# Altium footprint library Common Components.PcbLib: 94 footprints (part 1 of 6)
Each footprint in its own frame and in the unit in brackets; x right, y up, seen from the top. Pads: shape width x height; smd on the part's side, far side on the other; paste and mask are expansions set on the pad; w line width, h text height; cw(c..) or ccw(c..) is an arc to the next point about the centre after c.
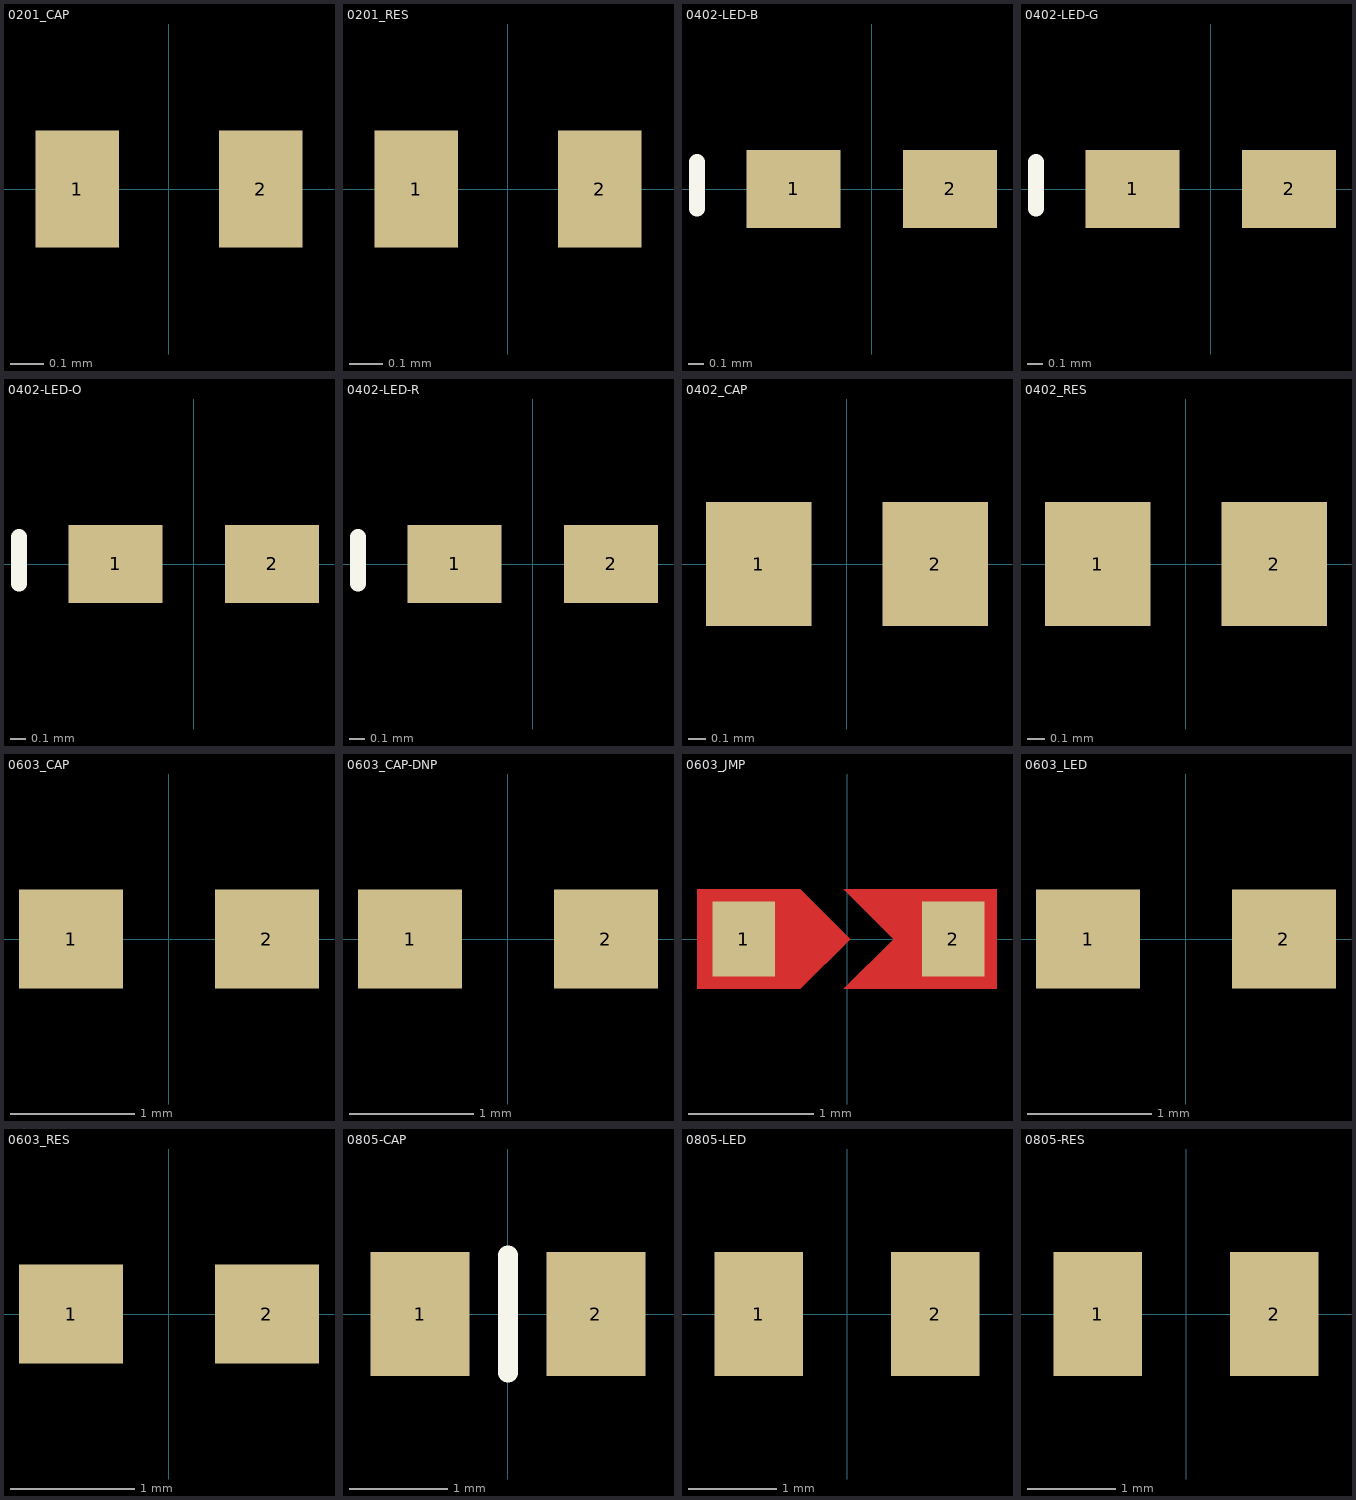
[diagram p0: the footprints below, top view; thin cyan lines are the x and y axes]

## 0201_CAP [mm]
pads (2):
  rect 0.25x0.35 smd: 1(-0.275,0) 2(0.275,0)
3D body "CAP_0201.step": height 0.31, standoff 0.01, extent -0.3,-0.15 0.3,0.15

## 0201_RES [mm]
pads (2):
  rect 0.25x0.35 smd: 1(-0.275,0) 2(0.275,0)
3D body "RES_0201.step": height 0.24, standoff 0.01, extent -0.3,-0.15 0.3,0.15

## 0402-LED-B [mm] "Chip LED, Blue 0402"
height 0.55
pads (2):
  rect 0.6x0.5 smd: 1(-0.5,0) 2(0.5,0)
Top Overlay:
  lines w0.1: -1.118,-0.127 -1.118,0.173
3D body "LED_0402_B.STEP": height 0.2, standoff 0, extent -0.5,-0.3 0.5,0.3

## 0402-LED-G [mm] "Chip LED, Green 0402"
height 0.55
pads (2):
  rect 0.6x0.5 smd: 1(-0.5,0) 2(0.5,0)
Top Overlay:
  lines w0.1: -1.118,-0.127 -1.118,0.173
3D body "LED_0402_G.STEP": height 0.2, standoff 0, extent -0.5,-0.3 0.5,0.3

## 0402-LED-O [mm] "Chip LED, Orange 0402"
height 0.55
pads (2):
  rect 0.6x0.5 smd: 1(-0.5,0) 2(0.5,0)
Top Overlay:
  lines w0.1: -1.118,-0.127 -1.118,0.173
3D body "LED_0402_O.STEP": height 0.2, standoff 0, extent -0.5,-0.3 0.5,0.3

## 0402-LED-R [mm] "Chip LED, Red 0402"
height 0.55
pads (2):
  rect 0.6x0.5 smd: 1(-0.5,0) 2(0.5,0)
Top Overlay:
  lines w0.1: -1.118,-0.127 -1.118,0.173
3D body "LED_0402_R.STEP": height 0.2, standoff 0, extent -0.5,-0.3 0.5,0.3

## 0402_CAP [mm]
pads (2):
  rect 0.6x0.7 smd: 1(-0.5,0) 2(0.5,0)
3D body "CAP_0402.step": height 0.51, standoff 0.01, extent -0.5,-0.25 0.5,0.25

## 0402_RES [mm]
pads (2):
  rect 0.6x0.7 smd: 1(-0.5,0) 2(0.5,0)
3D body "RES_0402.step": height 0.36, standoff 0.01, extent -0.5,-0.25 0.5,0.25

## 0603_CAP [mm]
pads (2):
  rect 0.838x0.8 smd: 1(-0.787,0) 2(0.788,0)
3D body "CAP_0603.step": height 0.81, standoff 0.01, extent -0.8,-0.4 0.8,0.4

## 0603_CAP-DNP [mm]
pads (2):
  rect 0.838x0.8 smd: 1(-0.787,0) 2(0.788,0)

## 0603_JMP [mm]
pads (2):
  rect 0.5x0.6 smd mask+0: 1(-0.825,0) 2(0.85,0)
Top Layer:
  region: -1.2,0.4 -0.375,0.4 0.025,0 -0.375,-0.4 -1.2,-0.4
  region: 1.2,0.4 1.2,-0.4 -0.025,-0.4 0.375,0 -0.025,0.4

## 0603_LED [mm]
pads (2):
  rect 0.838x0.8 smd: 1(-0.787,0) 2(0.788,0)
3D body "LED-0603.step": height 0.68, standoff 0, extent -0.808,-0.368 0.842,0.357

## 0603_RES [mm]
pads (2):
  rect 0.838x0.8 smd: 1(-0.787,0) 2(0.788,0)
3D body "SMD RES 0603.step": height 0.46, standoff 0.01, extent -0.8,-0.4 0.8,0.4

## 0805-CAP [mm] "Chip Capacitor"
pads (2):
  rect 1.016x1.27 smd: 1(-0.9,0) 2(0.9,0)
Top Overlay:
  lines w0.2: 0,-0.6 0,0.6
3D body "CAP_0805.step": height 0.61, standoff 0.01, extent -1,-0.625 1,0.625

## 0805-LED [mm]
pads (2):
  rect 1x1.4 smd: 1(-1,0) 2(1,0)
3D body "LED-0805.step": height 0.85, standoff 0.01, extent -1.059,-0.46 1.003,0.447

## 0805-RES [mm]
pads (2):
  rect 1x1.4 smd: 1(-1,0) 2(1,0)
3D body "RES_0805.step": height 0.61, standoff 0.01, extent -1,-0.625 1,0.625